# Altium footprint library IC.PcbLib: 85 footprints (part 3 of 6)
Each footprint in its own frame and in the unit in brackets; x right, y up, seen from the top. Pads: shape width x height; smd on the part's side, far side on the other; paste and mask are expansions set on the pad; w line width, h text height; cw(c..) or ccw(c..) is an arc to the next point about the centre after c.
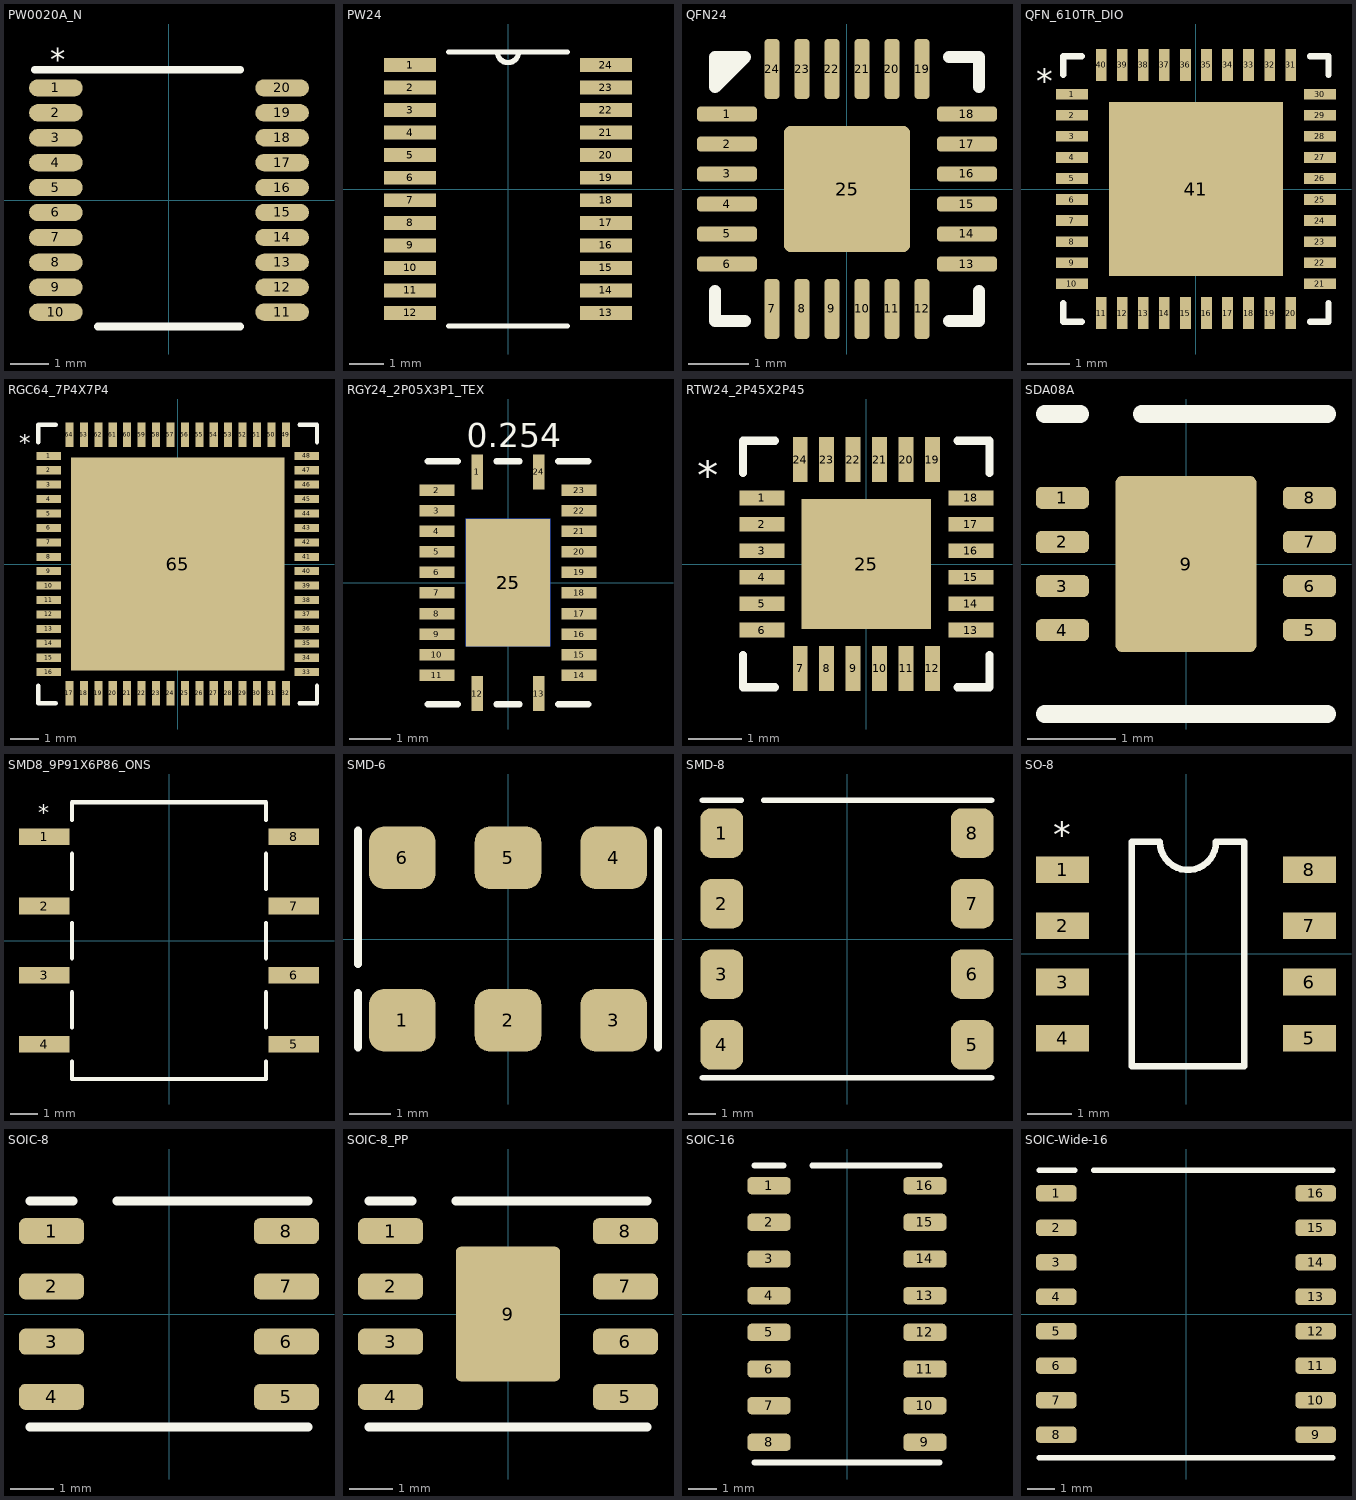
[diagram p2: the footprints below, top view; thin cyan lines are the x and y axes]

## PW0020A_N [mm]
pads (20):
  oval 1.4x0.45 smd paste+0 mask+0.051: 1(-2.95,2.925) 2(-2.95,2.275) 3(-2.95,1.625) 4(-2.95,0.975) 5(-2.95,0.325) 6(-2.95,-0.325) 7(-2.95,-0.975) 8(-2.95,-1.625) 9(-2.95,-2.275) 10(-2.95,-2.925) 11(2.95,-2.925) 12(2.95,-2.275) 13(2.95,-1.625) 14(2.95,-0.975) 15(2.95,-0.325) 16(2.95,0.325) 17(2.95,0.975) 18(2.95,1.625) 19(2.95,2.275) 20(2.95,2.925)
Top Overlay:
  lines w0.2: -3.5,3.4 1.85,3.4 ; -1.85,-3.3 1.85,-3.3
  text "*" at -3.1,3.2 h1
3D body "PW0020A.stp": height 1.13, standoff 0, extent -3.2,-3.25 3.2,3.25

## PW24 [mm]
pads (24):
  rect 1.5x0.4 smd: 1(-2.819,3.575) 2(-2.819,2.925) 3(-2.819,2.275) 4(-2.819,1.625) 5(-2.819,0.975) 6(-2.819,0.325) 7(-2.819,-0.325) 8(-2.819,-0.975) 9(-2.819,-1.625) 10(-2.819,-2.275) 11(-2.819,-2.925) 12(-2.819,-3.575) 13(2.819,-3.575) 14(2.819,-2.925) 15(2.819,-2.275) 16(2.819,-1.625) 17(2.819,-0.975) 18(2.819,-0.325) 19(2.819,0.325) 20(2.819,0.975) 21(2.819,1.625) 22(2.819,2.275) 23(2.819,2.925) 24(2.819,3.575)
Top Overlay:
  lines w0.152: -1.713,-3.95 1.713,-3.95 ; -1.713,3.95 1.713,3.95 ; -0.305,3.95 ccw(c0,3.95) 0.305,3.95
3D body "PW24.step": height 1.2, standoff 0, extent -3.302,-3.95 3.302,3.95

## QFN24 [mm]
pads (25):
  rrect50% 1x0.25 smd: 1(-2,1.25) 2(-2,0.75) 3(-2,0.25) 4(-2,-0.25) 5(-2,-0.75) 6(-2,-1.25) 13(2,-1.25) 14(2,-0.75) 15(2,-0.25) 16(2,0.25) 17(2,0.75) 18(2,1.25)
  rrect50% 0.25x1 smd: 7(-1.25,-2) 8(-0.75,-2) 9(-0.25,-2) 10(0.25,-2) 11(0.75,-2) 12(1.25,-2) 19(1.25,2) 20(0.75,2) 21(0.25,2) 22(-0.25,2) 23(-0.75,2) 24(-1.25,2)
  rrect10% 2.1x2.1 smd: 25(0,0)
Top Overlay:
  region: -2.2,2.2 -2.2,1.7 -1.7,2.2
  lines w0.2: -2.2,-1.7 -2.2,-2.2 -1.7,-2.2 ; 1.7,-2.2 2.2,-2.2 2.2,-1.7 ; 1.7,2.2 2.2,2.2 2.2,1.7 ; -2.2,1.7 -2.2,2.2 -1.7,2.2 -2.2,1.7
3D body "ATSAMD10D13A-MNT.STEP": height 0.9, standoff 0, extent -2,-2 2,2

## QFN_610TR_DIO [mil]
pads (41):
  rect 30x10 smd paste+0 mask+0: 1(-116,88.61) 2(-116,68.92) 3(-116,49.23) 4(-116,29.54) 5(-116,9.85) 6(-116,-9.85) 7(-116,-29.54) 8(-116,-49.23) 9(-116,-68.92) 10(-116,-88.61) 21(116,-88.61) 22(116,-68.92) 23(116,-49.23) 24(116,-29.54) 25(116,-9.85) 26(116,9.85) 27(116,29.54) 28(116,49.23) 29(116,68.92) 30(116,88.61)
  rect 10x30 smd paste+0 mask+0: 11(-88.61,-116) 12(-68.92,-116) 13(-49.23,-116) 14(-29.54,-116) 15(-9.85,-116) 16(9.85,-116) 17(29.54,-116) 18(49.23,-116) 19(68.92,-116) 20(88.61,-116) 31(88.61,116) 32(68.92,116) 33(49.23,116) 34(29.54,116) 35(9.85,116) 36(-9.85,116) 37(-29.54,116) 38(-49.23,116) 39(-68.92,116) 40(-88.61,116)
  rect 163x163 smd paste+0: 41(0,0)
Top Overlay:
  lines w6: -124,-106.7 -124,-124 -106.7,-124 ; -124,106.7 -124,124 -106.7,124 ; 106.7,-124 124,-124 124,-106.7 ; 106.7,124 124,124 124,106.7
  text "*" at -149.61,82.68 h39.37
3D body "QFN_610TR_DIO.step": height 32.09, standoff 0, extent -119.02,-119.02 119.02,119.02

## RGC64_7P4X7P4 [mm]
pads (65):
  rect 0.85x0.28 smd: 1(-4.475,3.75) 2(-4.475,3.25) 3(-4.475,2.75) 4(-4.475,2.25) 5(-4.475,1.75) 6(-4.475,1.25) 7(-4.475,0.75) 8(-4.475,0.25) 9(-4.475,-0.25) 10(-4.475,-0.75) 11(-4.475,-1.25) 12(-4.475,-1.75) 13(-4.475,-2.25) 14(-4.475,-2.75) 15(-4.475,-3.25) 16(-4.475,-3.75)
  rect 0.28x0.85 smd paste-0.14: 17(-3.751,-4.475) 18(-3.251,-4.475) 19(-2.751,-4.475) 20(-2.251,-4.475) 21(-1.75,-4.475) 22(-1.25,-4.475) 23(-0.75,-4.475) 24(-0.25,-4.475) 25(0.25,-4.475) 26(0.75,-4.475) 27(1.25,-4.475) 28(1.75,-4.475) 29(2.251,-4.475) 30(2.751,-4.475) 31(3.251,-4.475) 32(3.751,-4.475)
  rect 0.85x0.28 smd paste-0.14: 33(4.475,-3.75) 34(4.475,-3.25) 35(4.475,-2.75) 36(4.475,-2.25) 37(4.475,-1.75) 38(4.475,-1.25) 39(4.475,-0.75) 40(4.475,-0.25) 41(4.475,0.25) 42(4.475,0.75) 43(4.475,1.25) 44(4.475,1.75) 45(4.475,2.25) 46(4.475,2.75) 47(4.475,3.25) 48(4.475,3.75)
  rect 0.28x0.85 smd: 49(3.751,4.475) 50(3.251,4.475) 51(2.751,4.475) 52(2.251,4.475) 53(1.75,4.475) 54(1.25,4.475) 55(0.75,4.475) 56(0.25,4.475) 57(-0.25,4.475) 58(-0.75,4.475) 59(-1.25,4.475) 60(-1.75,4.475) 61(-2.251,4.475) 62(-2.751,4.475) 63(-3.251,4.475) 64(-3.751,4.475)
  rect 7.4x7.4 smd: 65(0,0)
Top Overlay:
  lines w0.152: -4.829,-4.223 -4.829,-4.829 -4.224,-4.829 ; -4.829,4.223 -4.829,4.829 -4.224,4.829 ; 4.224,-4.829 4.829,-4.829 4.829,-4.223 ; 4.224,4.829 4.829,4.829 4.829,4.223
  text "*" at -5.5,3.7 h1
3D body: height 0.25, standoff 0, extent 0,0 0.254,0.254
3D body "RGC0064H.stp": height 1, standoff 0, extent -4.5,-4.5 4.5,4.5

## RGY24_2P05X3P1_TEX [mm]
pads (26):
  rect 0.28x0.85 smd paste-0.14 mask+0: 1(-0.75,2.696) 12(-0.75,-2.696) 13(0.75,-2.696) 24(0.75,2.696)
  rect 0.85x0.28 smd paste-0.14 mask+0: 2(-1.731,2.25) 3(-1.731,1.75) 4(-1.731,1.25) 5(-1.731,0.75) 6(-1.731,0.25) 7(-1.731,-0.25) 8(-1.731,-0.75) 9(-1.731,-1.25) 10(-1.731,-1.75) 11(-1.731,-2.25) 14(1.731,-2.25) 15(1.731,-1.75) 16(1.731,-1.25) 17(1.731,-0.75) 18(1.731,-0.25) 19(1.731,0.25) 20(1.731,0.75) 21(1.731,1.25) 22(1.731,1.75) 23(1.731,2.25)
  rect 2.05x3.1 smd paste-1.537: 25(0,0)
  rect 2.05x3.1 smd far side paste-1.537 mask-1.537: 25(0,0)
Top Overlay:
  lines w0.152: -1.952,-2.952 -1.223,-2.952 ; -1.952,2.952 -1.223,2.952 ; -0.277,-2.952 0.277,-2.952 ; -0.277,2.952 0.277,2.952 ; 1.223,-2.952 1.952,-2.952 ; 1.223,2.952 1.952,2.952
  text "0.254" at -1,3.1 h1
Top Paste:
  drawing of 40 lines, arcs and shapes, not listed
Top Solder:
  region: 0,-1.55
  region: 0,-1.55
  region: 0,1.55
  region: 0,1.55
  region: -0.54,3.191 -0.96,3.191 -0.96,2.201 -0.54,2.201
  region: 0.96,3.191 0.54,3.191 0.54,2.201 0.96,2.201
  region: 2.226,2.46 1.236,2.46 1.236,2.04 2.226,2.04
  region: 2.226,1.96 1.236,1.96 1.236,1.54 2.226,1.54
  region: 2.226,1.46 1.236,1.46 1.236,1.04 2.226,1.04
  region: 2.226,0.96 1.236,0.96 1.236,0.54 2.226,0.54
  region: 2.226,0.46 1.236,0.46 1.236,0.04 2.226,0.04
  region: 2.226,-0.04 1.236,-0.04 1.236,-0.46 2.226,-0.46
  region: 2.226,-0.54 1.236,-0.54 1.236,-0.96 2.226,-0.96
  region: 2.226,-1.04 1.236,-1.04 1.236,-1.46 2.226,-1.46
  region: 2.226,-1.54 1.236,-1.54 1.236,-1.96 2.226,-1.96
  region: 2.226,-2.04 1.236,-2.04 1.236,-2.46 2.226,-2.46
  region: 0.96,-2.201 0.54,-2.201 0.54,-3.191 0.96,-3.191
  region: -0.54,-2.201 -0.96,-2.201 -0.96,-3.191 -0.54,-3.191
  region: -1.236,-2.04 -2.226,-2.04 -2.226,-2.46 -1.236,-2.46
  region: -1.236,-1.54 -2.226,-1.54 -2.226,-1.96 -1.236,-1.96
  region: -1.236,-1.04 -2.226,-1.04 -2.226,-1.46 -1.236,-1.46
  region: -1.236,-0.54 -2.226,-0.54 -2.226,-0.96 -1.236,-0.96
  region: -1.236,-0.04 -2.226,-0.04 -2.226,-0.46 -1.236,-0.46
  region: -1.236,0.46 -2.226,0.46 -2.226,0.04 -1.236,0.04
  region: -1.236,0.96 -2.226,0.96 -2.226,0.54 -1.236,0.54
  region: -1.236,1.46 -2.226,1.46 -2.226,1.04 -1.236,1.04
  region: -1.236,1.96 -2.226,1.96 -2.226,1.54 -1.236,1.54
  region: -1.236,2.46 -2.226,2.46 -2.226,2.04 -1.236,2.04
3D body "RGY24_2P05X3P1_TEX.step": height 1, standoff 0, extent -1.876,-2.876 1.876,2.876

## RTW24_2P45X2P45 [mm]
pads (25):
  rect 0.85x0.28 smd: 1(-1.975,1.25) 2(-1.975,0.75) 3(-1.975,0.25) 4(-1.975,-0.25) 5(-1.975,-0.75) 6(-1.975,-1.25) 13(1.975,-1.25) 14(1.975,-0.75) 15(1.975,-0.25) 16(1.975,0.25) 17(1.975,0.75) 18(1.975,1.25)
  rect 0.28x0.85 smd: 7(-1.25,-1.975) 8(-0.75,-1.975) 9(-0.25,-1.975) 10(0.25,-1.975) 11(0.75,-1.975) 12(1.25,-1.975) 19(1.25,1.975) 20(0.75,1.975) 21(0.25,1.975) 22(-0.25,1.975) 23(-0.75,1.975) 24(-1.25,1.975)
  rect 2.45x2.45 smd: 25(0,0)
Top Overlay:
  lines w0.152: -2.329,-1.723 -2.329,-2.329 -1.723,-2.329 ; -2.329,1.723 -2.329,2.329 -1.723,2.329 ; 1.723,-2.329 2.329,-2.329 2.329,-1.723 ; 1.723,2.329 2.329,2.329 2.329,1.723
  text "*" at -3.2,1.2 h1
Top Paste:
  region: -1.135,2.375 -1.365,2.375 -1.365,1.575 -1.135,1.575
  region: -0.635,2.375 -0.865,2.375 -0.865,1.575 -0.635,1.575
  region: -0.135,2.375 -0.365,2.375 -0.365,1.575 -0.135,1.575
  region: 0.365,2.375 0.135,2.375 0.135,1.575 0.365,1.575
  region: 0.865,2.375 0.635,2.375 0.635,1.575 0.865,1.575
  region: 1.365,2.375 1.135,2.375 1.135,1.575 1.365,1.575
  region: 2.375,1.365 1.575,1.365 1.575,1.135 2.375,1.135
  region: 2.375,0.865 1.575,0.865 1.575,0.635 2.375,0.635
  region: 2.375,0.365 1.575,0.365 1.575,0.135 2.375,0.135
  region: 2.375,-0.135 1.575,-0.135 1.575,-0.365 2.375,-0.365
  region: 2.375,-0.635 1.575,-0.635 1.575,-0.865 2.375,-0.865
  region: 2.375,-1.135 1.575,-1.135 1.575,-1.365 2.375,-1.365
  region: 1.365,-1.575 1.135,-1.575 1.135,-2.375 1.365,-2.375
  region: 0.865,-1.575 0.635,-1.575 0.635,-2.375 0.865,-2.375
  region: 0.365,-1.575 0.135,-1.575 0.135,-2.375 0.365,-2.375
  region: -0.135,-1.575 -0.365,-1.575 -0.365,-2.375 -0.135,-2.375
  region: -0.635,-1.575 -0.865,-1.575 -0.865,-2.375 -0.635,-2.375
  region: -1.135,-1.575 -1.365,-1.575 -1.365,-2.375 -1.135,-2.375
  region: -1.575,-1.135 -2.375,-1.135 -2.375,-1.365 -1.575,-1.365
  region: -1.575,-0.635 -2.375,-0.635 -2.375,-0.865 -1.575,-0.865
  region: -1.575,-0.135 -2.375,-0.135 -2.375,-0.365 -1.575,-0.365
  region: -1.575,0.365 -2.375,0.365 -2.375,0.135 -1.575,0.135
  region: -1.575,0.865 -2.375,0.865 -2.375,0.635 -1.575,0.635
  region: -1.575,1.365 -2.375,1.365 -2.375,1.135 -1.575,1.135
Top Solder:
  region: -1.04,2.47 -1.46,2.47 -1.46,1.48 -1.04,1.48
  region: -0.54,2.47 -0.96,2.47 -0.96,1.48 -0.54,1.48
  region: -0.04,2.47 -0.46,2.47 -0.46,1.48 -0.04,1.48
  region: 0.46,2.47 0.04,2.47 0.04,1.48 0.46,1.48
  region: 0.96,2.47 0.54,2.47 0.54,1.48 0.96,1.48
  region: 1.46,2.47 1.04,2.47 1.04,1.48 1.46,1.48
  region: 2.47,1.46 1.48,1.46 1.48,1.04 2.47,1.04
  region: 2.47,0.96 1.48,0.96 1.48,0.54 2.47,0.54
  region: 2.47,0.46 1.48,0.46 1.48,0.04 2.47,0.04
  region: 2.47,-0.04 1.48,-0.04 1.48,-0.46 2.47,-0.46
  region: 2.47,-0.54 1.48,-0.54 1.48,-0.96 2.47,-0.96
  region: 2.47,-1.04 1.48,-1.04 1.48,-1.46 2.47,-1.46
  region: 1.46,-1.48 1.04,-1.48 1.04,-2.47 1.46,-2.47
  region: 0.96,-1.48 0.54,-1.48 0.54,-2.47 0.96,-2.47
  region: 0.46,-1.48 0.04,-1.48 0.04,-2.47 0.46,-2.47
  region: -0.04,-1.48 -0.46,-1.48 -0.46,-2.47 -0.04,-2.47
  region: -0.54,-1.48 -0.96,-1.48 -0.96,-2.47 -0.54,-2.47
  region: -1.04,-1.48 -1.46,-1.48 -1.46,-2.47 -1.04,-2.47
  region: -1.48,-1.04 -2.47,-1.04 -2.47,-1.46 -1.48,-1.46
  region: -1.48,-0.54 -2.47,-0.54 -2.47,-0.96 -1.48,-0.96
  region: -1.48,-0.04 -2.47,-0.04 -2.47,-0.46 -1.48,-0.46
  region: -1.48,0.46 -2.47,0.46 -2.47,0.04 -1.48,0.04
  region: -1.48,0.96 -2.47,0.96 -2.47,0.54 -1.48,0.54
  region: -1.48,1.46 -2.47,1.46 -2.47,1.04 -1.48,1.04
3D body "RTW0024B.stp": height 0.8, standoff 0, extent -2,-2 2,2

## SDA08A [mm]
pads (9):
  rrect50% 0.6x0.25 smd: 1(-1.4,0.75) 2(-1.4,0.25) 3(-1.4,-0.25) 4(-1.4,-0.75) 5(1.4,-0.75) 6(1.4,-0.25) 7(1.4,0.25) 8(1.4,0.75)
  rrect10% 1.6x2 smd: 9(0,0)
Top Overlay:
  lines w0.2: -1.6,-1.7 1.6,-1.7 ; -1.6,1.7 -1.2,1.7 ; -0.5,1.7 1.6,1.7
3D body "SDA08A.stp": height 0.71, standoff 0, extent -1.6,-1.549 1.6,1.549

## SMD8_9P91X6P86_ONS [mil]
pads (8):
  rect 73x24 smd paste+0 mask+0: 1(-180.26,150) 2(-180.26,50) 3(-180.26,-50) 4(-180.26,-150) 5(180.26,-150) 6(180.26,-50) 7(180.26,50) 8(180.26,150)
Top Overlay:
  lines w6: -140,-174.55 -140,-200 140,-200 140,-174.55 ; -140,-125.45 -140,-74.55 ; -140,-25.45 -140,25.45 ; -140,74.55 -140,125.45 ; -140,174.55 -140,200 140,200 140,174.55 ; 140,-125.45 140,-74.55 ; 140,-25.45 140,25.45 ; 140,74.55 140,125.45
  text "*" at -188.98,165.35 h39.37
3D body "SMD8_9P91X6P86_ONS.step": height 200.12, standoff 0, extent -202.76,-195 202.75,195

## SMD-6 [mm]
pads (6):
  rrect50% 1.6x1.5 smd: 1(-2.54,-1.95) 2(0,-1.95) 3(2.54,-1.95) 4(2.54,1.95) 5(0,1.95) 6(-2.54,1.95)
Top Overlay:
  lines w0.2: -3.6,-2.6 -3.6,-1.3 ; -3.6,-0.6 -3.6,2.6 ; 3.6,-2.6 3.6,2.6
3D body "User Library-EG-2121CA.STEP": height 1.2, standoff 0, extent -3.502,-2.502 3.502,2.503

## SMD-8 [mm]
pads (8):
  rrect50% 1.54x1.78 smd: 1(-4.507,3.81) 2(-4.507,1.27) 3(-4.507,-1.27) 4(-4.507,-3.81) 5(4.507,-3.81) 6(4.507,-1.27) 7(4.507,1.27) 8(4.507,3.81)
Top Overlay:
  lines w0.2: -5.2,-5 3.8,-5 5.2,-5 ; -5.2,5 -3.8,5 ; -3,5 5.2,5
3D body "HCPL2631SDM.STEP": height 5.08, standoff 0, extent -5.15,-4.827 5.15,4.828

## SO-8 [mm]
pads (8):
  rect 1.2x0.6 smd: 1(-2.794,1.905) 2(-2.794,0.635) 3(-2.794,-0.635) 4(-2.794,-1.905) 5(2.794,-1.905) 6(2.794,-0.635) 7(2.794,0.635) 8(2.794,1.905)
Top Overlay:
  lines w0.15: -1.226,-2.545 1.314,-2.545 1.314,2.535 0.679,2.535 cw(c0.044,2.535) -0.591,2.535 -1.226,2.535 -1.226,-2.545
  text "*" at -3,2.221 h1
3D body "User Library-so8-4.STEP": height 1.76, standoff 0, extent -3.068,-2.445 3.069,2.445

## SOIC-8 [mm]
pads (8):
  rrect50% 1.5x0.6 smd: 1(-2.7,1.905) 2(-2.7,0.635) 3(-2.7,-0.635) 4(-2.7,-1.905) 5(2.7,-1.905) 6(2.7,-0.635) 7(2.7,0.635) 8(2.7,1.905)
Top Overlay:
  lines w0.2: -3.2,-2.6 3.2,-2.6 ; -3.2,2.6 -2.2,2.6 ; -1.2,2.6 3.2,2.6
3D body "STM32G031J6M6.STEP": height 1.75, standoff 0, extent -3,-2.45 3,2.45

## SOIC-8_PP [mm]
pads (9):
  rrect50% 1.5x0.6 smd: 1(-2.7,1.905) 2(-2.7,0.635) 3(-2.7,-0.635) 4(-2.7,-1.905) 5(2.7,-1.905) 6(2.7,-0.635) 7(2.7,0.635) 8(2.7,1.905)
  rrect10% 2.4x3.1 smd: 9(0,0)
Top Overlay:
  lines w0.2: -3.2,-2.6 3.2,-2.6 ; -3.2,2.6 -2.2,2.6 ; -1.2,2.6 3.2,2.6
3D body "STM32G031J6M6.STEP": height 1.75, standoff 0, extent -3,-2.45 3,2.45

## SOIC-16 [mm]
pads (16):
  rrect50% 1.5x0.6 smd: 1(-2.7,4.445) 2(-2.7,3.175) 3(-2.7,1.905) 4(-2.7,0.635) 5(-2.7,-0.635) 6(-2.7,-1.905) 7(-2.7,-3.175) 8(-2.7,-4.445) 9(2.7,-4.445) 10(2.7,-3.175) 11(2.7,-1.905) 12(2.7,-0.635) 13(2.7,0.635) 14(2.7,1.905) 15(2.7,3.175) 16(2.7,4.445)
Top Overlay:
  lines w0.2: -3.2,-5.14 3.2,-5.14 ; -3.2,5.14 -2.2,5.14 ; -1.2,5.14 3.2,5.14
3D body "AM26LV32ID.STEP": height 1.75, standoff 0, extent -2.997,-4.953 2.997,4.953

## SOIC-Wide-16 [mm]
pads (16):
  rrect50% 1.5x0.6 smd: 1(-4.775,4.445) 2(-4.775,3.175) 3(-4.775,1.905) 4(-4.775,0.635) 5(-4.775,-0.635) 6(-4.775,-1.905) 7(-4.775,-3.175) 8(-4.775,-4.445) 9(4.775,-4.445) 10(4.775,-3.175) 11(4.775,-1.905) 12(4.775,-0.635) 13(4.775,0.635) 14(4.775,1.905) 15(4.775,3.175) 16(4.775,4.445)
Top Overlay:
  lines w0.2: -5.4,-5.3 5.4,-5.3 ; -5.4,5.3 -4.1,5.3 ; -3.4,5.3 5.4,5.3
3D body "UC2825DWTR.STEP": height 2.65, standoff 0, extent -5.15,-5.15 5.15,5.15